# Altium footprint library DipComponent.PcbLib: 303 footprints (part 2 of 19)
Each footprint in its own frame and in the unit in brackets; x right, y up, seen from the top. Pads: shape width x height; smd on the part's side, far side on the other; paste and mask are expansions set on the pad; w line width, h text height; cw(c..) or ccw(c..) is an arc to the next point about the centre after c.
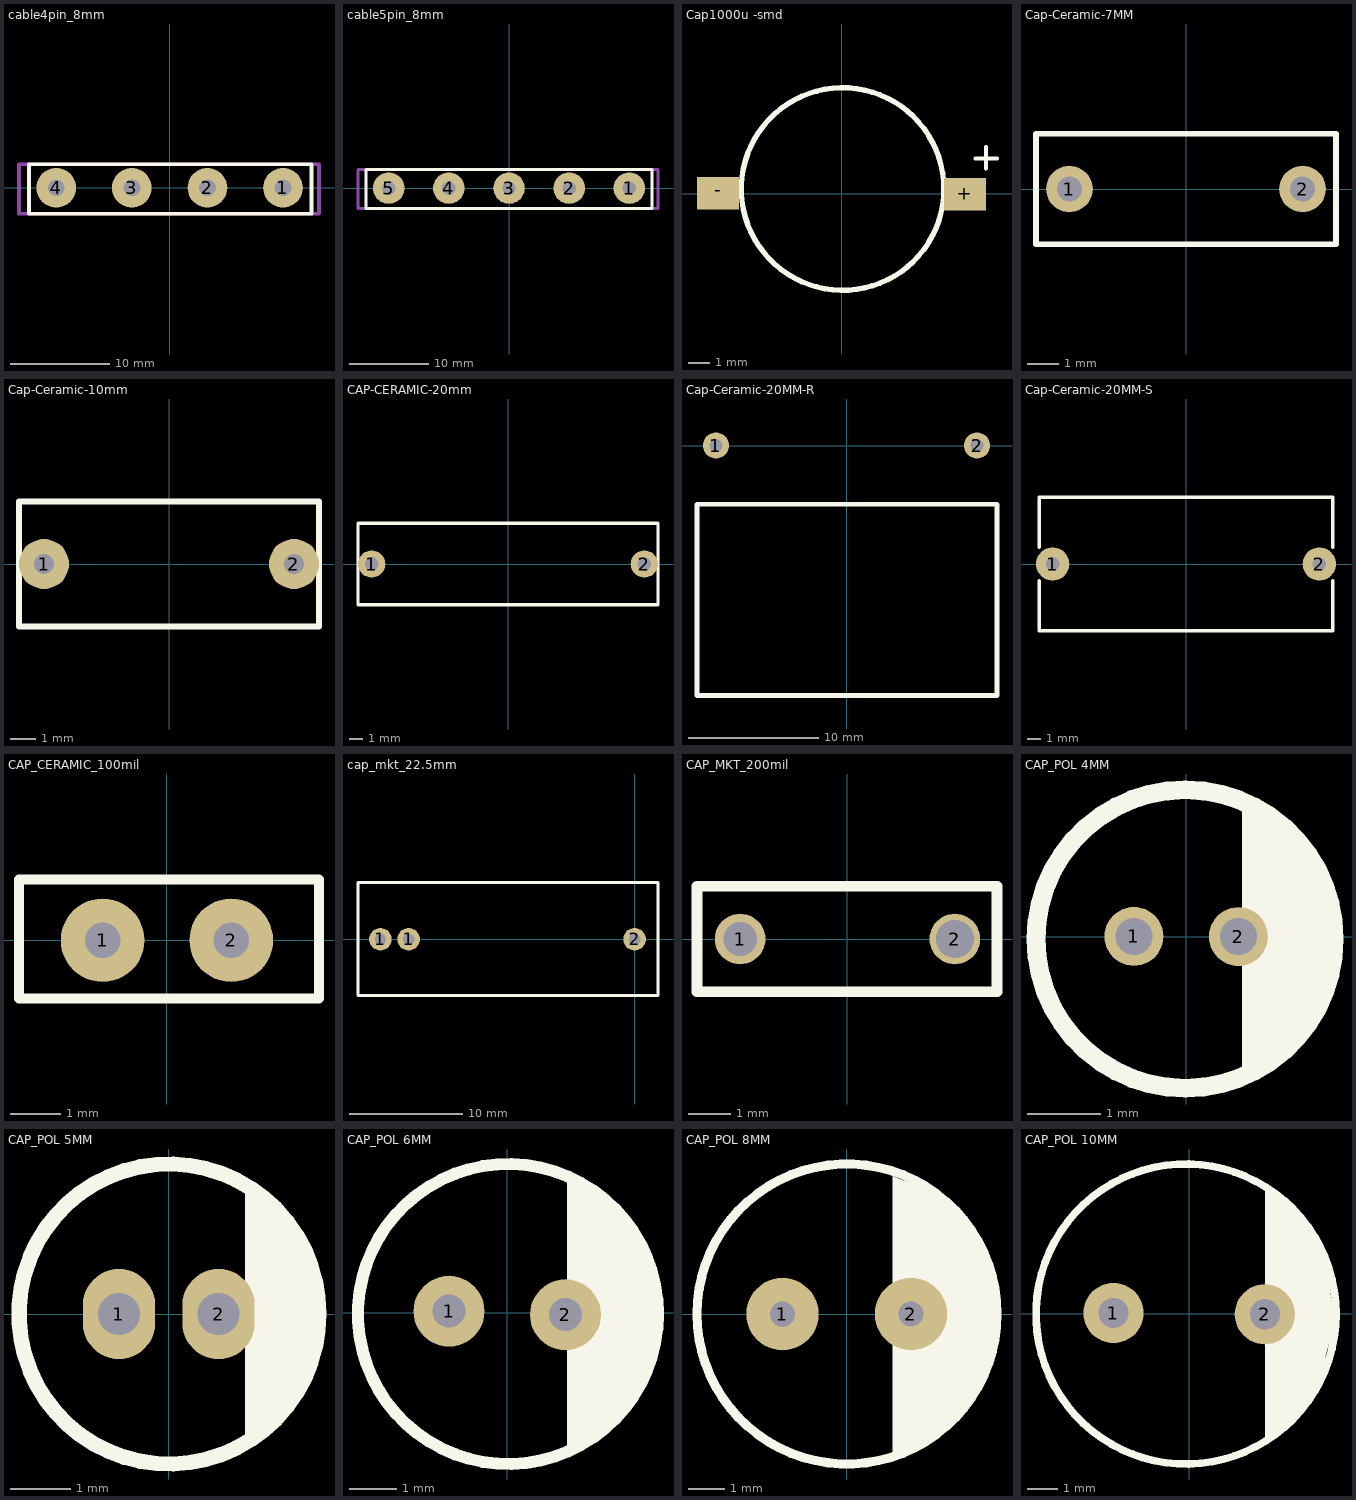
[diagram p1: the footprints below, top view; thin cyan lines are the x and y axes]

## cable4pin_8mm [mm]
pads (4):
  round 4 hole 1.7: 1(11.43,0) 2(3.81,0) 3(-3.81,0) 4(-11.43,0)
Top Overlay:
  lines w0.381: -14.19,-2.62 14.31,-2.62 14.31,2.38 -14.19,2.38 -14.19,-2.62
Mechanical 15:
  lines w0.381: -15.19,-2.62 15.06,-2.62 15.06,2.38 -15.19,2.38 -15.19,-2.62

## cable5pin_8mm [mm]
pads (5):
  round 4 hole 1.7: 1(15.24,0) 2(7.62,0) 3(0,0) 4(-7.62,0) 5(-15.24,0)
Top Overlay:
  lines w0.381: -18.13,-2.62 18.12,-2.62 18.12,2.38 -18.13,2.38 -18.13,-2.62
Mechanical 15:
  lines w0.381: -19.13,-2.62 18.87,-2.62 18.87,2.38 -19.13,2.38 -19.13,-2.62

## Cap1000u -smd [mm]
pads (2):
  rect 2x1.524 smd: +(5.85,-0.025) -(-5.85,0.025)
Top Overlay:
  circle w0.254: c0.05,0.225 r4.8
  lines w0.2: 6.351,1.675 7.367,1.675 ; 6.848,1.202 6.848,2.218
3D body "SW3dPS-capacitor size G.STEP": height 10.21, standoff -0.01, extent -5.65,-5.075 5.95,5.225

## Cap-Ceramic-7MM [mm] "400V 1NF"
pads (2):
  round 1.5 hole 0.8: 1(-3.75,0) 2(3.75,0)
Top Overlay:
  lines w0.178: -4.826,-1.778 -4.826,1.778 4.826,1.778 4.826,-1.778 -4.826,-1.778
3D body "CAP750 8_9x7x3_6.STEP": height 8, standoff -9, extent -4.383,-1.768 4.417,1.833

## Cap-Ceramic-10mm [mm] "400V 1NF"
pads (2):
  round 2 hole 0.8: 1(-5,0) 2(5,0)
Top Overlay:
  lines w0.254: -6,-2.5 -6,2.5 6,2.5 6,-2.5 -6,-2.5
3D body "cap10mm.STEP": height 9.5, standoff -2, extent -5.721,-2.311 5.779,2.309

## CAP-CERAMIC-20mm [mm]
pads (2):
  round 2 hole 1: 1(-10,0) 2(10,0)
Top Overlay:
  lines w0.254: -11,-3 -11,3 11,3 11,-3 -11,-3
3D body "cap20mm.STEP": height 15.2, standoff -2, extent -10.699,-2.925 10.801,2.875

## Cap-Ceramic-20MM-R [mm]
pads (2):
  round 2 hole 1: 1(-10,0) 2(10,0)
Top Overlay:
  lines w0.381: -11.45,-19.15 -11.45,-4.5 11.525,-4.5 11.525,-19.15 -11.1,-19.15 -11.45,-19.15
3D body "cap20mmRight.step": height 13, standoff 0, extent -10.975,-19 11.025,0.4

## Cap-Ceramic-20MM-S [mm]
pads (2):
  round 2.5 hole 1: 1(-10,0) 2(10,0)
Top Overlay:
  lines w0.254: -11,-1.25 -11,-5 11,-5 11,-1.25 ; -11,1.25 -11,5 11,5 11,1.25
3D body "CL21_MEF_0_82UF_630V.step": height 17.5, standoff -1.9, extent -11,-8 11,5

## CAP_CERAMIC_100mil [mm]
pads (2):
  round 1.65 hole 0.7: 1(-1.27,0) 2(1.27,0)
Top Overlay:
  lines w0.2: 2.95,1.2 -2.919,1.2 -2.919,-1.15 3,-1.15 3,1.2
3D body "SW3dPS-Cap 100n.STEP": height 6.92, standoff -1, extent -2.919,-0.889 2.919,0.808

## cap_mkt_22.5mm [mm]
pads (3):
  round 2 hole 1: 1(-22.5,0) 1(-20,0) 2(0,0)
Top Overlay:
  lines w0.254: -24.483,-4.978 2.064,-4.978 2.064,5.022 -24.436,5.022 -24.483,5.022 -24.483,-4.978
3D body "CAP 27x10x20 P22_5.step": height 19.6, standoff -2.4, extent -24.436,-4.978 2.064,5.022

## CAP_MKT_200mil [mm] "200mil pin"
pads (2):
  round 1.2 hole 0.8: 1(-2.54,0)
  round 1.2 hole 0.9: 2(2.54,0)
Top Overlay:
  lines w0.254: -3.561,-1.25 3.539,-1.25 3.539,1.25 -3.561,1.25 -3.561,-1.25
3D body "User Library-B32529C_2_5x6_5x7_3.step": height 7.1, standoff -2.9, extent -3.625,-1.25 3.675,1.25

## CAP_POL 4MM [mm]
pads (2):
  round 0.8 hole 0.5: 1(-0.709,0.002) 2(0.709,-0.002)
Top Overlay:
  circle w0.254: c-0.014,-0.034 r2.023
  region: 0.762,1.778 1.27,1.524 1.524,1.27 2.032,0.254 2.032,-0.254 1.778,-1.016 0.762,-2.032
3D body "User Library-Cap 4x7.STEP": height 8.5, standoff -15.5, extent -2.048,-1.941 1.952,2.059

## CAP_POL 5MM [mm]
pads (2):
  oval 1.2x1.5 hole 0.7: 1(-0.827,0) 2(0.827,0)
Top Overlay:
  circle w0.254: c0.004,0.001 r2.491
  region: 1.27,-2.032 1.27,2.032 1.778,1.778 2.286,1.27 2.495,0.001 2.032,-1.524
3D body "User Library-CE_R200_D200_H460.STEP": height 11.7, standoff -4.9, extent -2.739,-2.6 2.841,2.479

## CAP_POL 6MM [mm]
pads (2):
  round 1.5 hole 0.7: 1(-1.231,0.037) 2(1.231,-0.037)
Top Overlay:
  circle w0.254: c0.016,-0.023 r3.171
  region: 1.27,-3.048 1.27,2.794 2.032,2.54 2.794,1.524 3.187,-0.023 2.794,-1.778
3D body "SW3dPS-Cap electro 6.3x11x2.5mm.STEP": height 11.53, standoff -3.01, extent -3.165,-3.154 3.185,3.197

## CAP_POL 8MM [mm]
pads (2):
  round 2 hole 0.7: 1(-1.775,-0.001) 2(1.775,0.001)
Top Overlay:
  circle w0.254: c0.007,0.001 r4.142
  region: 1.27,3.81 2.54,3.302 3.556,2.032 4.064,0.508 4.064,-0.762 3.556,-2.032 2.286,-3.556 1.27,-4.064
3D body "SW3dPS-Cap electro 8x11.5x3.5mm.STEP": height 12.03, standoff -3.48, extent -4.021,-3.975 4.03,4.075

## CAP_POL 10MM [mm]
pads (2):
  round 2 hole 1: 1(-2.517,0.02) 2(2.517,-0.02)
Top Overlay:
  circle w0.254: c-0.104,-0.012 r4.991
  region: 2.54,-4.318 2.54,4.318 3.81,3.048 4.572,1.524 4.826,-0.254 4.318,-2.286 3.302,-3.81
3D body "User Library-CE_R200_D400_H400.STEP": height 10.16, standoff -2.3, extent -5.131,-5.069 5.029,5.091